# Altium footprint library eLIB.PcbLib: 206 footprints (part 11 of 13)
Each footprint in its own frame and in the unit in brackets; x right, y up, seen from the top. Pads: shape width x height; smd on the part's side, far side on the other; paste and mask are expansions set on the pad; w line width, h text height; cw(c..) or ccw(c..) is an arc to the next point about the centre after c.
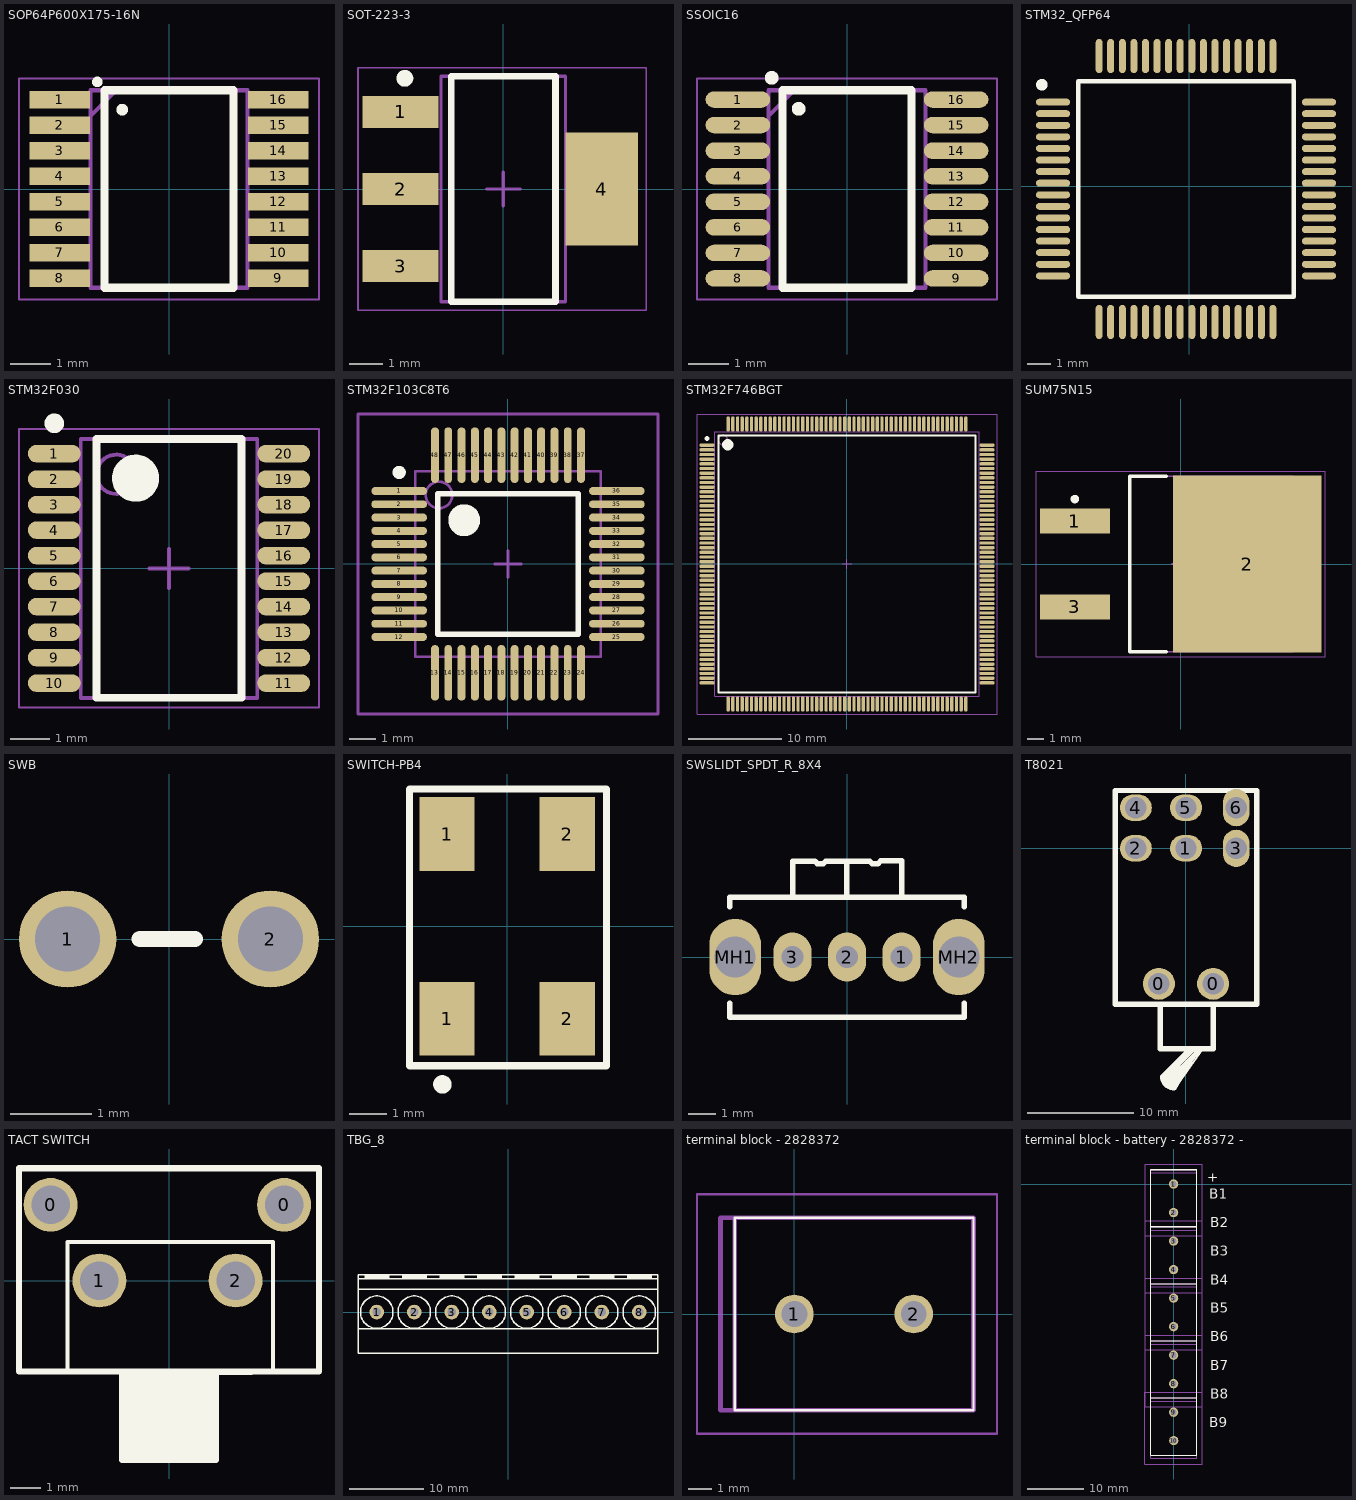
[diagram p10: the footprints below, top view; thin cyan lines are the x and y axes]

## SOP64P600X175-16N [mm]
pads (16):
  rect 1.5x0.435 smd: 1(-2.711,2.222) 2(-2.711,1.588) 3(-2.711,0.952) 4(-2.711,0.318) 5(-2.711,-0.318) 6(-2.711,-0.952) 7(-2.711,-1.588) 8(-2.711,-2.222) 9(2.711,-2.222) 10(2.711,-1.588) 11(2.711,-0.952) 12(2.711,-0.318) 13(2.711,0.318) 14(2.711,0.952) 15(2.711,1.588) 16(2.711,2.222)
Top Overlay:
  circle w0.2: c-1.78,2.66 r0.03
  circle w0.2: c-1.16,1.97 r0.045
  lines w0.2: -1.598,-2.452 -1.598,2.452 1.598,2.452 1.598,-2.452 -1.598,-2.452
Mechanical 13:
  lines w0.1: -1.948,1.818 -1.312,2.452 ; -1.948,-2.452 -1.948,2.452 1.948,2.452 1.948,-2.452 -1.948,-2.452
Mechanical 15:
  lines w0.05: -3.725,-2.75 -3.725,2.75 3.725,2.75 3.725,-2.75 -3.725,-2.75
3D body "ISO7740DBQ.stp": height 1.75, standoff 0, extent -2.997,-2.452 2.997,2.452

## SOT-223-3 [mm]
pads (4):
  rect 2.25x0.95 smd: 1(-3.052,2.29) 2(-3.052,0) 3(-3.052,-2.29)
  rect 2.15x3.35 smd: 4(2.925,0)
Top Overlay:
  circle w0.25: c-2.925,3.29 r0.125
  lines w0.2: -1.55,-3.35 -1.55,3.35 1.55,3.35 1.55,-3.35 -1.55,-3.35
Mechanical 13:
  lines w0.1: -1.85,-3.35 -1.85,3.35 1.85,3.35 1.85,-3.35 -1.85,-3.35
Mechanical 15:
  lines w0.05: -4.318,-3.6 -4.318,3.6 4.25,3.6 4.25,-3.6 -4.318,-3.6
  lines w0.1: -0.5,0 0.5,0 ; 0,-0.5 0,0.5
3D body "User Library-AMS1117.STEP": height 1.85, standoff -0.01, extent -3.67,-3.25 3.33,3.25

## SSOIC16 [mm]
pads (16):
  oval 1.6x0.41 smd: 1(-2.711,2.222) 2(-2.711,1.588) 3(-2.711,0.952) 4(-2.711,0.318) 5(-2.711,-0.318) 6(-2.711,-0.952) 7(-2.711,-1.588) 8(-2.711,-2.222) 9(2.711,-2.222) 10(2.711,-1.588) 11(2.711,-0.952) 12(2.711,-0.318) 13(2.711,0.318) 14(2.711,0.952) 15(2.711,1.588) 16(2.711,2.222)
Top Overlay:
  circle w0.2: c-1.871,2.76 r0.071
  circle w0.2: c-1.201,1.99 r0.071
  lines w0.2: -1.598,-2.452 1.598,-2.452 1.598,2.452 -1.598,2.452 -1.598,-2.452
Mechanical 13:
  lines w0.1: -1.948,1.818 -1.312,2.452 ; -1.948,-2.452 1.948,-2.452 1.948,2.452 -1.948,2.452 -1.948,-2.452
Mechanical 15:
  lines w0.05: -3.725,-2.75 3.725,-2.75 3.725,2.75 -3.725,2.75 -3.725,-2.75
3D body "ISO7740DBQ.stp": height 1.75, standoff 0, extent -2.997,-2.452 2.997,2.452

## STM32_QFP64 [mm] "QFP50P1200X1200X160-64N"
pads (64):
  oval 1.475x0.3 smd: 1(-5.868,3.63) 2(-5.868,3.13) 3(-5.868,2.63) 4(-5.868,2.13) 5(-5.868,1.63) 6(-5.868,1.13) 7(-5.868,0.63) 8(-5.868,0.13) 9(-5.868,-0.37) 10(-5.868,-0.87) 11(-5.868,-1.37) 12(-5.868,-1.87) 13(-5.868,-2.37) 14(-5.868,-2.87) 15(-5.868,-3.37) 16(-5.868,-3.87) 33(5.608,-3.87) 34(5.608,-3.37) 35(5.608,-2.87) 36(5.608,-2.37) 37(5.608,-1.87) 38(5.608,-1.37) 39(5.608,-0.87) 40(5.608,-0.37) 41(5.608,0.13) 42(5.608,0.63) 43(5.608,1.13) 44(5.608,1.63) 45(5.608,2.13) 46(5.608,2.63) 47(5.608,3.13) 48(5.608,3.63)
  oval 0.3x1.475 smd: 17(-3.88,-5.858) 18(-3.38,-5.858) 19(-2.88,-5.858) 20(-2.38,-5.858) 21(-1.88,-5.858) 22(-1.38,-5.858) 23(-0.88,-5.858) 24(-0.38,-5.858) 25(0.12,-5.858) 26(0.62,-5.858) 27(1.12,-5.858) 28(1.62,-5.858) 29(2.12,-5.858) 30(2.62,-5.858) 31(3.12,-5.858) 32(3.62,-5.858) 49(3.62,5.618) 50(3.12,5.618) 51(2.62,5.618) 52(2.12,5.618) 53(1.62,5.618) 54(1.12,5.618) 55(0.62,5.618) 56(0.12,5.618) 57(-0.38,5.618) 58(-0.88,5.618) 59(-1.38,5.618) 60(-1.88,5.618) 61(-2.38,5.618) 62(-2.88,5.618) 63(-3.38,5.618) 64(-3.88,5.618)
Top Overlay:
  circle w0.25: c-6.355,4.38 r0.125
  lines w0.2: -4.78,-4.77 -4.78,4.53 4.52,4.53 4.52,-4.77 -4.78,-4.77
3D body "LQFP64 v1.step": height 1.6, standoff 0.02, extent -6.189,-6.219 5.949,5.919

## STM32F030 [mm] "TSOP, 20-Leads, Body 6.50x4.40mm, Pitch 0.65mm, IPC Medium Density"
height 1.2
pads (20):
  oval 1.35x0.45 smd: 1(-2.925,2.925) 2(-2.925,2.275) 3(-2.925,1.625) 4(-2.925,0.975) 5(-2.925,0.325) 6(-2.925,-0.325) 7(-2.925,-0.975) 8(-2.925,-1.625) 9(-2.925,-2.275) 10(-2.925,-2.925) 11(2.925,-2.925) 12(2.925,-2.275) 13(2.925,-1.625) 14(2.925,-0.975) 15(2.925,-0.325) 16(2.925,0.325) 17(2.925,0.975) 18(2.925,1.625) 19(2.925,2.275) 20(2.925,2.925)
Top Overlay:
  circle w0.25: c-2.925,3.7 r0.125
  circle w0.6: c-0.85,2.3 r0.3
  lines w0.2: -1.85,-3.3 -1.85,3.3 1.85,3.3 1.85,-3.3 -1.85,-3.3
Mechanical 13:
  circle w0.1: c-1.35,2.4 r0.5
  lines w0.1: -2.25,-3.3 -2.25,3.3 2.25,3.3 2.25,-3.3 -2.25,-3.3
Mechanical 15:
  lines w0.05: -3.825,-3.55 -3.825,3.55 3.825,3.55 3.825,-3.55 -3.825,-3.55
  lines w0.1: -0.5,0 0.5,0 ; 0,-0.5 0,0.5
3D body: height 1.2, standoff 0.05, extent -2.25,-3.3 2.25,3.3

## STM32F103C8T6 [mm] "Thin QFP, 48-Leads, Body 7x7mm, Pitch 0.5mm, IPC Low Density"
height 1.6
pads (48):
  oval 2.1x0.3 smd: 1(-4.1,2.75) 2(-4.1,2.25) 3(-4.1,1.75) 4(-4.1,1.25) 5(-4.1,0.75) 6(-4.1,0.25) 7(-4.1,-0.25) 8(-4.1,-0.75) 9(-4.1,-1.25) 10(-4.1,-1.75) 11(-4.1,-2.25) 12(-4.1,-2.75) 25(4.1,-2.75) 26(4.1,-2.25) 27(4.1,-1.75) 28(4.1,-1.25) 29(4.1,-0.75) 30(4.1,-0.25) 31(4.1,0.25) 32(4.1,0.75) 33(4.1,1.25) 34(4.1,1.75) 35(4.1,2.25) 36(4.1,2.75)
  oval 0.3x2.1 smd: 13(-2.75,-4.1) 14(-2.25,-4.1) 15(-1.75,-4.1) 16(-1.25,-4.1) 17(-0.75,-4.1) 18(-0.25,-4.1) 19(0.25,-4.1) 20(0.75,-4.1) 21(1.25,-4.1) 22(1.75,-4.1) 23(2.25,-4.1) 24(2.75,-4.1) 37(2.75,4.1) 38(2.25,4.1) 39(1.75,4.1) 40(1.25,4.1) 41(0.75,4.1) 42(0.25,4.1) 43(-0.25,4.1) 44(-0.75,4.1) 45(-1.25,4.1) 46(-1.75,4.1) 47(-2.25,4.1) 48(-2.75,4.1)
Top Overlay:
  circle w0.6: c-1.65,1.65 r0.3
  circle w0.25: c-4.1,3.45 r0.125
  lines w0.2: -2.65,-2.65 2.65,-2.65 2.65,2.65 -2.65,2.65 -2.65,-2.65
Mechanical 13:
  circle w0.1: c-2.6,2.6 r0.5
  lines w0.1: -3.5,-3.5 3.5,-3.5 3.5,3.5 -3.5,3.5 -3.5,-3.5
Mechanical 15:
  lines w0.1: -0.5,0 0.5,0 ; 0,-0.5 0,0.5 ; -5.65,-5.65 5.65,-5.65 5.65,5.65 -5.65,5.65 -5.65,-5.65
3D body "User Library-LQFP50P900X900X160.STEP": height 1.6, standoff 0, extent -4.5,-4.5 4.5,4.5

## STM32F746BGT [mm] "LQFP208, 28 x 28 mm, 208-pin low-profile quad flat package"
height 2.45
pads (208):
  oval 1.65x0.35 smd: 1(-15.025,12.75) 2(-15.025,12.25) 3(-15.025,11.75) 4(-15.025,11.25) 5(-15.025,10.75) 6(-15.025,10.25) 7(-15.025,9.75) 8(-15.025,9.25) 9(-15.025,8.75) 10(-15.025,8.25) 11(-15.025,7.75) 12(-15.025,7.25) 13(-15.025,6.75) 14(-15.025,6.25) 15(-15.025,5.75) 16(-15.025,5.25) 17(-15.025,4.75) 18(-15.025,4.25) 19(-15.025,3.75) 20(-15.025,3.25) 21(-15.025,2.75) 22(-15.025,2.25) 23(-15.025,1.75) 24(-15.025,1.25) 25(-15.025,0.75) 26(-15.025,0.25) 27(-15.025,-0.25) 28(-15.025,-0.75) 29(-15.025,-1.25) 30(-15.025,-1.75) 31(-15.025,-2.25) 32(-15.025,-2.75) 33(-15.025,-3.25) 34(-15.025,-3.75) 35(-15.025,-4.25) 36(-15.025,-4.75) 37(-15.025,-5.25) 38(-15.025,-5.75) 39(-15.025,-6.25) 40(-15.025,-6.75) 41(-15.025,-7.25) 42(-15.025,-7.75) 43(-15.025,-8.25) 44(-15.025,-8.75) 45(-15.025,-9.25) 46(-15.025,-9.75) 47(-15.025,-10.25) 48(-15.025,-10.75) 49(-15.025,-11.25) 50(-15.025,-11.75) 51(-15.025,-12.25) 52(-15.025,-12.75) 105(15.025,-12.75) 106(15.025,-12.25) 107(15.025,-11.75) 108(15.025,-11.25) 109(15.025,-10.75) 110(15.025,-10.25) 111(15.025,-9.75) 112(15.025,-9.25) 113(15.025,-8.75) 114(15.025,-8.25) 115(15.025,-7.75) 116(15.025,-7.25) 117(15.025,-6.75) 118(15.025,-6.25) 119(15.025,-5.75) 120(15.025,-5.25) 121(15.025,-4.75) 122(15.025,-4.25) 123(15.025,-3.75) 124(15.025,-3.25) 125(15.025,-2.75) 126(15.025,-2.25) 127(15.025,-1.75) 128(15.025,-1.25) 129(15.025,-0.75) 130(15.025,-0.25) 131(15.025,0.25) 132(15.025,0.75) 133(15.025,1.25) 134(15.025,1.75) 135(15.025,2.25) 136(15.025,2.75) 137(15.025,3.25) 138(15.025,3.75) 139(15.025,4.25) 140(15.025,4.75) 141(15.025,5.25) 142(15.025,5.75) 143(15.025,6.25) 144(15.025,6.75) 145(15.025,7.25) 146(15.025,7.75) 147(15.025,8.25) 148(15.025,8.75) 149(15.025,9.25) 150(15.025,9.75) 151(15.025,10.25) 152(15.025,10.75) 153(15.025,11.25) 154(15.025,11.75) 155(15.025,12.25) 156(15.025,12.75)
  oval 0.35x1.65 smd: 53(-12.75,-15.025) 54(-12.25,-15.025) 55(-11.75,-15.025) 56(-11.25,-15.025) 57(-10.75,-15.025) 58(-10.25,-15.025) 59(-9.75,-15.025) 60(-9.25,-15.025) 61(-8.75,-15.025) 62(-8.25,-15.025) 63(-7.75,-15.025) 64(-7.25,-15.025) 65(-6.75,-15.025) 66(-6.25,-15.025) 67(-5.75,-15.025) 68(-5.25,-15.025) 69(-4.75,-15.025) 70(-4.25,-15.025) 71(-3.75,-15.025) 72(-3.25,-15.025) 73(-2.75,-15.025) 74(-2.25,-15.025) 75(-1.75,-15.025) 76(-1.25,-15.025) 77(-0.75,-15.025) 78(-0.25,-15.025) 79(0.25,-15.025) 80(0.75,-15.025) 81(1.25,-15.025) 82(1.75,-15.025) 83(2.25,-15.025) 84(2.75,-15.025) 85(3.25,-15.025) 86(3.75,-15.025) 87(4.25,-15.025) 88(4.75,-15.025) 89(5.25,-15.025) 90(5.75,-15.025) 91(6.25,-15.025) 92(6.75,-15.025) 93(7.25,-15.025) 94(7.75,-15.025) 95(8.25,-15.025) 96(8.75,-15.025) 97(9.25,-15.025) 98(9.75,-15.025) 99(10.25,-15.025) 100(10.75,-15.025) 101(11.25,-15.025) 102(11.75,-15.025) 103(12.25,-15.025) 104(12.75,-15.025) 157(12.75,15.025) 158(12.25,15.025) 159(11.75,15.025) 160(11.25,15.025) 161(10.75,15.025) 162(10.25,15.025) 163(9.75,15.025) 164(9.25,15.025) 165(8.75,15.025) 166(8.25,15.025) 167(7.75,15.025) 168(7.25,15.025) 169(6.75,15.025) 170(6.25,15.025) 171(5.75,15.025) 172(5.25,15.025) 173(4.75,15.025) 174(4.25,15.025) 175(3.75,15.025) 176(3.25,15.025) 177(2.75,15.025) 178(2.25,15.025) 179(1.75,15.025) 180(1.25,15.025) 181(0.75,15.025) 182(0.25,15.025) 183(-0.25,15.025) 184(-0.75,15.025) 185(-1.25,15.025) 186(-1.75,15.025) 187(-2.25,15.025) 188(-2.75,15.025) 189(-3.25,15.025) 190(-3.75,15.025) 191(-4.25,15.025) 192(-4.75,15.025) 193(-5.25,15.025) 194(-5.75,15.025) 195(-6.25,15.025) 196(-6.75,15.025) 197(-7.25,15.025) 198(-7.75,15.025) 199(-8.25,15.025) 200(-8.75,15.025) 201(-9.25,15.025) 202(-9.75,15.025) 203(-10.25,15.025) 204(-10.75,15.025) 205(-11.25,15.025) 206(-11.75,15.025) 207(-12.25,15.025) 208(-12.75,15.025)
Top Overlay:
  circle w0.6: c-12.8,12.8 r0.3
  circle w0.25: c-15.025,13.475 r0.125
  lines w0.2: -13.8,-13.8 13.8,-13.8 13.8,13.8 -13.8,13.8 -13.8,-13.8
Mechanical 13:
  circle w0.1: c-13.3,13.3 r0.5
  lines w0.1: -14.2,-14.2 14.2,-14.2 14.2,14.2 -14.2,14.2 -14.2,-14.2
Mechanical 15:
  lines w0.05: -16.1,-16.1 16.1,-16.1 16.1,16.1 -16.1,16.1 -16.1,-16.1
  lines w0.1: -0.5,0 0.5,0 ; 0,-0.5 0,0.5
3D body: height 2.45, standoff 0.25, extent -14.2,-14.2 14.2,14.2

## SUM75N15 [mm] "D2-PAK, 3-Pads, Body 7.93x8.57mm (max), IPC Medium Density"
height 4.83
pads (3):
  rect 4.15x1.5 smd: 1(-6.25,2.54) 3(-6.25,-2.54)
  rect 8.8x10.5 smd: 2(3.95,0)
Top Overlay:
  circle w0.25: c-6.25,3.84 r0.125
  lines w0.2: -0.85,-5.2 -3,-5.2 -3,5.2 -0.85,5.2
Mechanical 13:
  lines w0.1: -3,-5.2 6.65,-5.2 6.65,5.2 -3,5.2 -3,-5.2
Mechanical 15:
  lines w0.05: -8.55,-5.5 8.55,-5.5 8.55,5.5 -8.55,5.5 -8.55,-5.5
  lines w0.1: -0.5,0 0.5,0 ; 0,-0.5 0,0.5
3D body: height 4.83, standoff 0, extent -3,-5.2 6.65,5.2

## SWB [mm]
pads (2):
  round 1.2 hole 0.8: 1(-1.25,0) 2(1.25,0)
Top Overlay:
  lines w0.2: -0.36,0 0.32,0

## SWITCH-PB4 [mm]
pads (4):
  rect 1.5x2 smd: 1(-1.627,-2.5) 1(-1.627,2.5) 2(1.627,-2.5) 2(1.627,2.5)
Top Overlay:
  circle w0.25: c-1.754,-4.278 r0.125
  lines w0.2: -2.643,-3.77 -2.643,3.723 2.691,3.723 2.691,-3.77 -2.643,-3.77
3D body: height 2, standoff 1.5, extent -0.968,-0.958 1.024,1.038
3D body: height 1.5, standoff 0, extent -2.389,-2.5 2.437,2.453

## SWSLIDT_SPDT_R_8X4 [mm] "Subminiator SPDT switch"
pads (5):
  oval 1.4x1.8 hole 0.8: 1(2,0) 2(0,0) 3(-2,0)
  oval 1.9x2.8 hole 1.5: MH1(-4.1,0) MH2(4.1,0)
Top Overlay:
  lines w0.2: -4.3,-1.7 -4.3,-2.2 4.3,-2.2 4.3,-1.7 ; -4.3,1.842 -4.3,2.2 4.303,2.2 4.303,1.842 ; -1.987,2.213 -1.987,3.519 -1.181,3.519 -1.087,3.425 ; -1.08,3.418 -0.878,3.418 -0.774,3.522 ; -0.773,3.521 -0.01,3.521 ; -0.01,2.234 -0.01,3.521 ; 0.924,3.427 0.83,3.521 -0.01,3.521 ; 0.931,3.42 1.133,3.42 1.237,3.524 2.001,3.524 2.001,2.224
3D body "User Library-CK_Slide.step": height 4.7, standoff -2.79, extent -4.311,-2.28 4.3,6.093

## T8021 [mm]
height 0.88
pads (8):
  round 3 hole 2: 0(-2.54,-12.7) 0(2.54,-12.7)
  oval 3x2.5 hole 2: 1(0,0) 2(-4.7,0) 4(-4.7,3.81) 5(0,3.81)
  oval 2.5x3.5 hole 2: 3(4.7,0) 6(4.7,3.81)
Top Overlay:
  lines w0.2: -0.54,-18.755 2.51,-18.755 ; 0.31,-18.755 -2.29,-21.355 ccw(c-1.09,-21.355) -1.09,-22.555 1.61,-18.755
  lines w0.3: -2.19,-21.555 0.511,-18.805 ; -2.09,-21.755 0.811,-18.805 ; -1.94,-21.955 1.08,-18.955 ; -1.84,-22.205 1.08,-18.955 ; -1.59,-22.305 1.368,-18.804 ; -1.39,-22.405 0.96,-19.287 ; -1.069,-22.382 -1.009,-21.899 ; -0.54,-18.755 2.51,-18.755 ; 0.16,-18.905 -2.29,-21.355 ccw(c-1.09,-21.355) -1.09,-22.555 ; 0.37,-18.948 1.074,-18.948 cw(c1.074,-18.955) 1.08,-18.955 ; 0.459,-19.952 -1.09,-22.555 ; -1.09,-22.555 -1.09,-22.555
  lines w0.508: -6.604,-14.605 -2.413,-14.605 -2.413,-18.771 2.565,-18.771 2.565,-14.605 6.452,-14.605 ; -6.35,5.418 6.35,5.418 ; -5.69,5.418 -6.629,5.418 -6.629,-14.605 6.629,-14.605 6.629,5.418 5.309,5.418

## TACT SWITCH [mil]
pads (4):
  round 70 hole 50: 0(-153.94,98.43) 0(149.61,98.43) 1(-90.55,0) 2(86.61,0)
Top Overlay:
  rectangle: -60.94,-233 60.06,-118.11
  lines w5: -132,-118.11 135,-118.11 135,50 75,50 -75,50 -132,50 -132,-118.11
  lines w8: -61,-119 -61,-233 16,-233 ; -16,-233 61,-233 61,-119 107,-119 ; 195,109 195,146 -195,146 -195,-118.11 195,-118.11 195,142
3D body "tact switch.stp": height 291.34, standoff -137.8, extent -170.07,-243.3 172.45,156.31

## TBG_8 [mm] "Terminal Block Green"
pads (8):
  round 2 / inner round 2 / far side oval 2.4x3 hole 1.2: 1(-17.78,0) 2(-12.7,0) 3(-7.62,0) 4(-2.54,0) 5(2.54,0) 6(7.62,0) 7(12.7,0) 8(17.78,0)
Top Overlay:
  circle w0.2: c-17.78,0 r2.2
  circle w0.2: c-12.7,0 r2.2
  circle w0.2: c-7.62,0 r2.2
  circle w0.2: c-2.54,0 r2.2
  circle w0.2: c2.54,0 r2.2
  circle w0.2: c7.62,0 r2.2
  circle w0.2: c12.7,0 r2.2
  circle w0.2: c17.78,0 r2.2
  rectangle: -19.44,4.5 -16.04,5.08
  rectangle: -14.36,4.5 -10.96,5.08
  rectangle: -9.28,4.5 -5.88,5.08
  rectangle: -4.2,4.5 -0.8,5.08
  rectangle: 0.88,4.5 4.28,5.08
  rectangle: 5.96,4.5 9.36,5.08
  rectangle: 11.04,4.5 14.44,5.08
  rectangle: 16.12,4.5 19.52,5.08
  lines w0.2: -20.32,-2.27 20.32,-2.27 ; -20.32,3.07 20.32,3.07 ; -20.32,4.5 20.32,4.5 ; -20.32,-5.6 20.32,-5.6 20.32,5.08 -20.32,5.08 -20.32,-5.6
3D body "User Library-klema-5mm-3pin.step": height 14.1, standoff -3.9, extent 5.2,-5.5 20.2,5
3D body "User Library-klema-5mm-3pin.step": height 14.1, standoff -3.9, extent -10.04,-5.5 4.96,5
3D body "User Library-klema-5mm-2pin.step": height 14, standoff -4, extent -20.24,-5.5 -10.24,5

## terminal block - 2828372 [mm] "terminal block 2 pin"
pads (2):
  round 1.65 hole 1.1: 1(0,0) 2(5.08,0)
Top Overlay:
  lines w0.1: -2.54,-4.1 -2.54,4.1 7.62,4.1 7.62,-4.1 -2.54,-4.1
Mechanical 13:
  lines w0.2: -2.54,-4.1 -3.14,-4.1 -3.14,4.1 -2.54,4.1 ; -2.54,-4.1 -2.54,4.1 ; -2.54,-4.1 -2.54,4.1 ; -2.54,-4.1 7.62,-4.1 7.62,4.1 -2.54,4.1
Mechanical 15:
  lines w0.1: -4.14,-5.1 -4.14,5.1 8.62,5.1 8.62,-5.1 -4.14,-5.1
3D body "282837-2.stp": height 9.84, standoff -3.66, extent -2.51,-4.11 8.25,4.09

## terminal block - battery - 2828372 - [mm] "terminal block 2 pin"
pads (10):
  round 1.65 hole 1.1: 1(0,0) 2(0,-5.08) 3(0,-10.16) 4(0,-15.24) 5(0,-20.32) 6(0,-25.4) 7(0,-30.48) 8(0,-35.56) 9(0,-40.64) 10(0.02,-45.69)
Top Overlay:
  lines w0.1: -4.07,2.6 4.13,2.6 ; -4.09,-27.91 4.11,-27.91 ; -4.09,-27.91 -4.09,-17.75 4.11,-17.75 4.11,-27.91 ; -4.09,-27.91 4.11,-27.91 ; -4.09,-27.91 -4.09,-38.07 4.11,-38.07 4.11,-27.91 ; -4.1,-48.26 -4.1,-38.1 4.1,-38.1 4.1,-48.26 -4.1,-48.26 ; -4.08,-17.72 -4.08,-7.56 4.12,-7.56 4.12,-17.72 -4.08,-17.72 ; -4.08,-7.59 4.12,-7.59 4.12,2.57 -4.08,2.57 -4.08,-7.59
  text "B9" at 6.37,-43.912 h3
  text "B8" at 6.506,-38.824 h3
  text "B7" at 6.506,-33.781 h3
  text "B5" at 6.506,-23.573 h3
  text "B4" at 6.506,-18.527 h3
  text "B3" at 6.506,-13.403 h3
  text "B2" at 6.506,-8.357 h3
  text "B1" at 6.37,-3.272 h3
  text "B6" at 6.506,-28.658 h3
  text "+" at 5.964,-0.224 h3
Mechanical 13:
  lines w0.2: -4.1,-48.26 -4.1,-38.1 4.1,-38.1 4.1,-48.26 ; -4.1,-48.26 4.1,-48.26 ; -4.1,-48.26 -4.1,-48.86 4.1,-48.86 4.1,-48.26 ; -4.1,-48.26 4.1,-48.26 ; -4.09,-38.07 4.11,-38.07 ; -4.09,-38.07 -4.09,-38.67 4.11,-38.67 4.11,-38.07 ; -4.09,-38.07 4.11,-38.07 ; -4.09,-38.07 -4.09,-27.91 ; -4.09,-27.91 4.11,-27.91 ; -4.09,-27.91 -4.09,-28.51 4.11,-28.51 4.11,-27.91 ; -4.09,-27.91 4.11,-27.91 ; -4.09,-27.91 -4.09,-17.75 4.11,-17.75 4.11,-27.91 ; -4.09,-27.91 4.11,-27.91 ; -4.08,-17.72 -4.08,-7.56 4.12,-7.56 4.12,-17.72 ; -4.08,-17.72 4.12,-17.72 ; -4.08,-17.72 -4.08,-18.32 4.12,-18.32 4.12,-17.72 ; -4.08,-17.72 4.12,-17.72 ; -4.08,-7.59 4.12,-7.59 ; -4.08,-7.59 -4.08,-8.19 4.12,-8.19 4.12,-7.59 ; -4.08,-7.59 4.12,-7.59 ; -4.08,-7.59 -4.08,2.57 4.12,2.57 4.12,-7.59 ; -4.07,2.6 4.13,2.6 ; -4.07,2.6 -4.07,2 4.13,2 4.13,2.6 ; -4.07,2.6 4.13,2.6 ; 4.11,-38.07 4.11,-27.91
Mechanical 15:
  lines w0.1: -5.1,-49.86 -5.1,-37.1 5.1,-37.1 5.1,-49.86 -5.1,-49.86 ; -5.09,-39.67 5.11,-39.67 5.11,-26.91 -5.09,-26.91 -5.09,-39.67 ; -5.09,-29.51 5.11,-29.51 5.11,-16.75 -5.09,-16.75 -5.09,-29.51 ; -5.08,-19.32 -5.08,-6.56 5.12,-6.56 5.12,-19.32 -5.08,-19.32 ; -5.08,-9.19 5.12,-9.19 5.12,3.57 -5.08,3.57 -5.08,-9.19
3D body "282837-2.stp": height 9.84, standoff -3.66, extent -4.07,-7.56 4.13,3.2
3D body "282837-2.stp": height 9.84, standoff -3.66, extent -4.07,-17.69 4.13,-6.93
3D body "282837-2.stp": height 9.84, standoff -3.66, extent -4.08,-38.04 4.12,-27.28
3D body "282837-2.stp": height 9.84, standoff -3.66, extent -4.09,-48.23 4.11,-37.47
3D body "282837-2.stp": height 9.84, standoff -3.66, extent -4.08,-27.88 4.12,-17.12